# Altium footprint library mainLib.PcbLib: 169 footprints (part 10 of 11)
Each footprint in its own frame and in the unit in brackets; x right, y up, seen from the top. Pads: shape width x height; smd on the part's side, far side on the other; paste and mask are expansions set on the pad; w line width, h text height; cw(c..) or ccw(c..) is an arc to the next point about the centre after c.
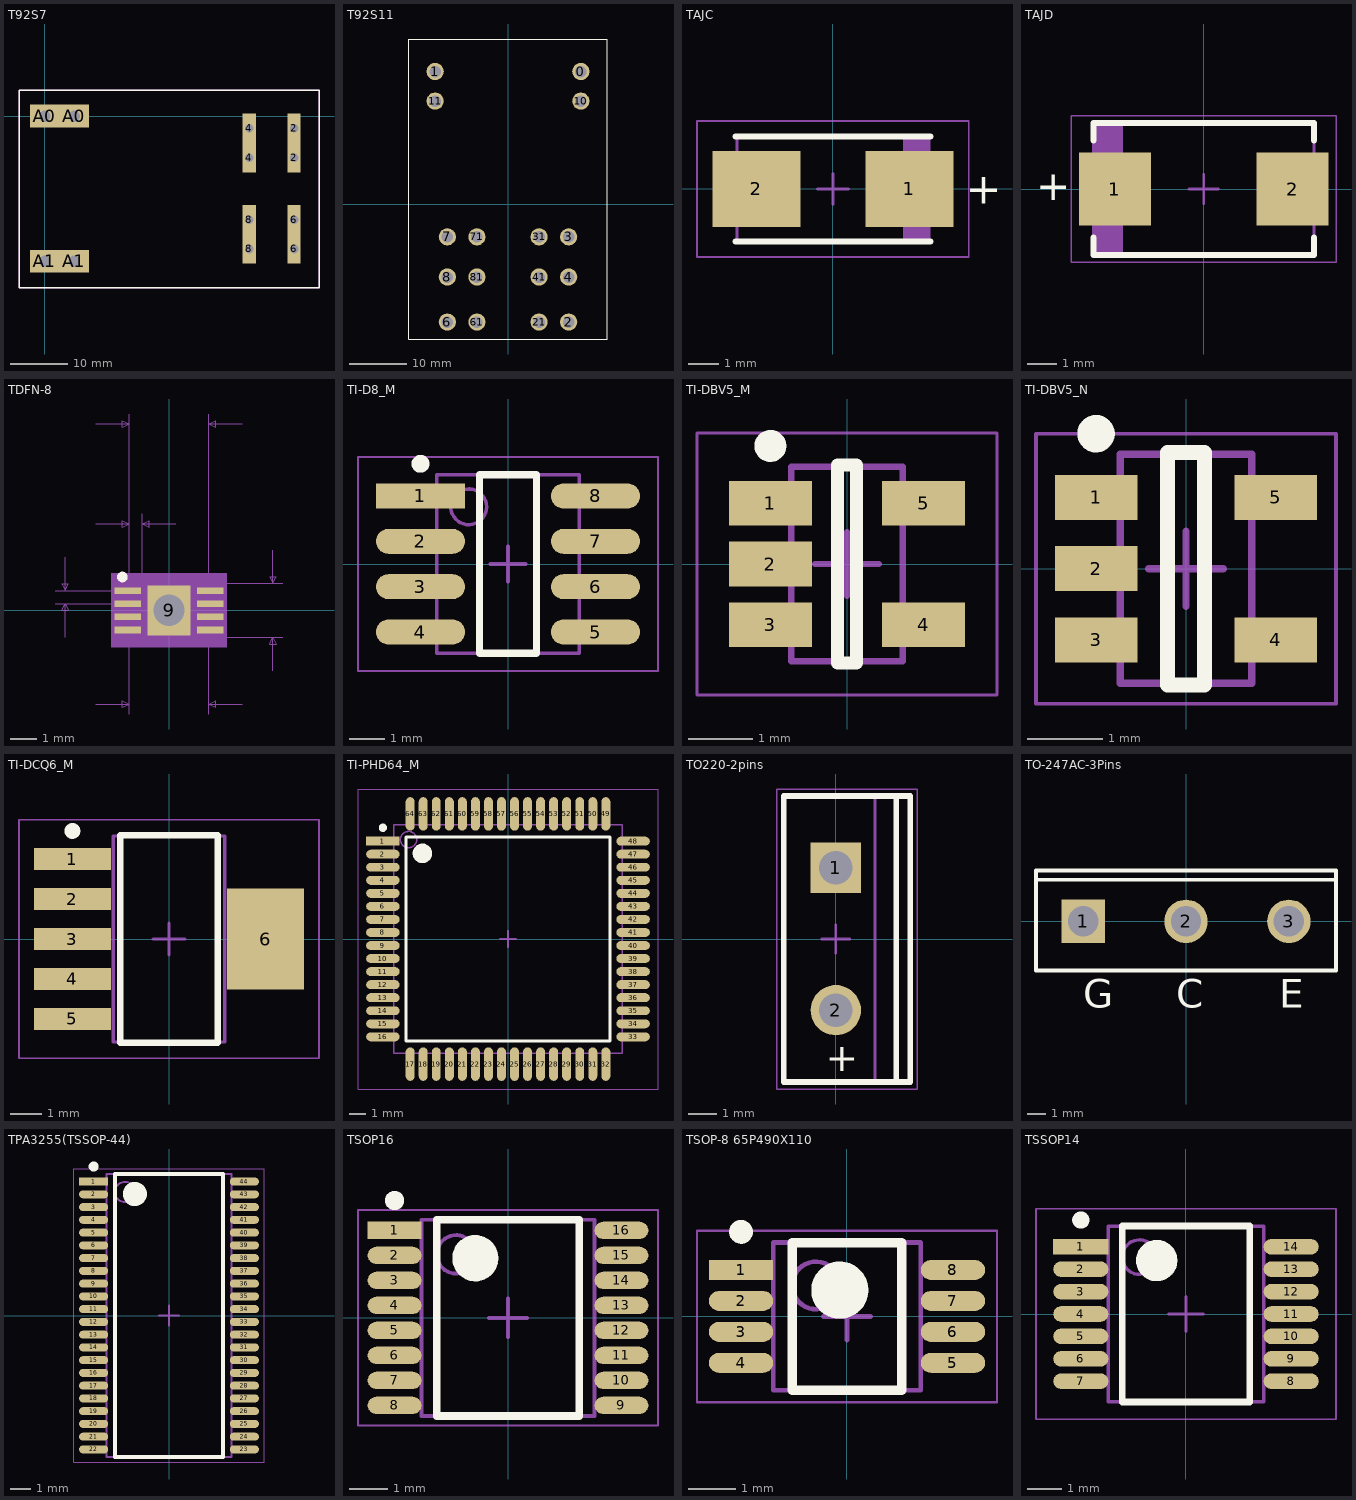
[diagram p9: the footprints below, top view; thin cyan lines are the x and y axes]

## T92S7 [mm]
pads (12):
  rect 2.3x5.15 hole 1.5: 2(43.65,-7.275) 2(43.65,-2.125) 4(35.8,-7.275) 4(35.8,-2.125) 6(43.65,-23.25) 6(43.65,-18.1) 8(35.8,-23.25) 8(35.8,-18.1)
  rect 5.15x4 hole 2: A0(0,0) A0(5.15,0) A1(0,-25.4) A1(5.15,-25.4)
Top Overlay:
  lines w0.254: -4.5,-30 48,-30 48,4 48,4.5 -4.5,4.5 -4.5,-30
Mechanical 13:
  lines w0.254: -4.5,-30 48,-30 48,4.5 -4.5,4.5 -4.5,-30 ; -2,-26.5 7,-26.5 7,-24.5 -2,-24.5 -2,-26.5 ; -2,-1 7,-1 7,1 -2,1 -2,-1 ; 35,-25 36.5,-25 36.5,-16.5 35,-16.5 35,-25 ; 35,-9 36.5,-9 36.5,-1 36.5,-0.5 35,-0.5 35,-8.5 35,-9 ; 43,-25 44.5,-25 44.5,-16.5 43,-16.5 43,-25 ; 43,-9 44.5,-9 44.5,-0.5 43,-0.5 43,-9
3D body: height 3, standoff 0, extent -1.999,-26.499 6.999,-24.501
3D body: height 3, standoff 0, extent -1.999,-26.499 6.999,-24.501
3D body: height 27.8, standoff 3, extent -4.627,-30.127 48.127,4.627
3D body: height 3, standoff 0, extent 43.001,-8.999 44.499,-0.501
3D body: height 3, standoff 0, extent 35.001,-8.999 36.499,-0.501
3D body: height 3, standoff 0, extent 43.001,-24.999 44.499,-16.501
3D body: height 3, standoff 0, extent 35.001,-24.999 36.499,-16.501
3D body: height 3, standoff 0, extent -1.999,-0.999 6.999,0.999

## T92S11 [mm]
pads (16):
  round 3 hole 2: 0(12.7,23.13) 1(-12.7,23.13) 2(10.58,-20.55) 3(10.58,-5.69) 4(10.58,-12.7) 6(-10.58,-20.55) 7(-10.58,-5.69) 8(-10.58,-12.7) 10(12.7,17.97) 11(-12.7,17.97) 21(5.42,-20.55) 31(5.42,-5.69) 41(5.42,-12.7) 61(-5.42,-20.55) 71(-5.42,-5.69) 81(-5.42,-12.7)
Top Overlay:
  lines w0.152: -17.3,-23.5 -17.3,28.8 17.3,28.8 17.3,-23.5 -17.3,-23.5
3D body "T92_3d.stp": height 30.75, standoff -3.95, extent -17.272,-23.545 17.272,28.779

## TAJC [mm] "Molded Capacitor, 2-Leads, Body 6,00x3,25mm, IPC Low Density"
height 2.6
pads (2):
  rect 2.85x2.45 smd: 1(2.475,0) 2(-2.475,0)
Top Overlay:
  lines w0.2: -3.15,-1.7 3.15,-1.7 ; -3.15,1.7 3.15,1.7
  text "+" at 4.293,-0.483 h1.02
Mechanical 13:
  rectangle: 2.266,-1.7 3.1,1.7
  lines w0.1: -3.1,-1.7 3.1,-1.7 3.1,1.7 -3.1,1.7 -3.1,-1.7
Mechanical 15:
  lines w0.05: -4.4,-2.2 4.4,-2.2 4.4,2.2 -4.4,2.2 -4.4,-2.2
  lines w0.1: -0.5,0 0.5,0 ; 0,-0.5 0,0.5
3D body: height 2.61, standoff 2.6, extent 2.287,-1.397 2.794,1.397
3D body "CAPMP6032X26M.step": height 2.6, standoff 0, extent -3.32,-1.7 3.32,1.7

## TAJD [mm] "Molded Capacitor, 2-Leads, Body 7,30x4,35mm, IPC Medium Density"
height 2
pads (2):
  rect 2.45x2.5 smd: 1(-3.025,0) 2(3.025,0)
Top Overlay:
  lines w0.2: -3.75,-1.65 -3.75,-2.25 3.75,-2.25 3.75,-1.65 ; -3.75,1.65 -3.75,2.25 3.75,2.25 3.75,1.65
  text "+" at -5.707,-0.383 h1.02
Mechanical 13:
  rectangle: -3.75,-2.25 -2.741,2.25
  lines w0.1: -3.75,-2.25 3.75,-2.25 3.75,2.25 -3.75,2.25 -3.75,-2.25
Mechanical 15:
  lines w0.05: -4.5,-2.5 4.5,-2.5 4.5,2.5 -4.5,2.5 -4.5,-2.5
  lines w0.1: -0.5,0 0.5,0 ; 0,-0.5 0,0.5
3D body "User Library-Tantalum Cap Case D.STEP": height 2.8, standoff 0, extent -3.57,-2.15 3.57,2.15

## TDFN-8 [mm] "MAX31740"
pads (10):
  round 0 hole 1.2: 0(0,0)
  rect 1x0.25 smd paste+0 mask+0: 1(-1.57,0.75) 2(-1.57,0.25) 3(-1.57,-0.25) 4(-1.57,-0.75) 5(1.57,-0.75) 6(1.57,-0.25) 7(1.57,0.25) 8(1.57,0.75)
  rect 1.653x1.905 smd paste+0 mask+0: 9(0,0)
Top Overlay:
  circle w0.25: c-1.778,1.27 r0.076
Mechanical 5:
  region: 2.205,-1.41 -2.205,-1.41 -2.205,1.41 2.205,1.41
Mechanical 7:
  lines w0.025: -4.341,0.25 -1.42,0.25 ; -4.341,0.75 -1.42,0.75 ; -3.96,-1.02 -3.96,0.25 ; -3.96,2.02 -3.96,0.75 ; -2.794,-3.569 -1.524,-3.569 ; -2.794,3.29 -1.524,3.29 ; -2.794,7.1 -1.524,7.1 ; -1.524,-3.95 -1.524,-1.029 ; -1.524,3.671 -1.524,0.75 -1.524,7.481 ; -1.016,0.75 -1.016,3.671 ; 0.254,3.29 -1.016,3.29 ; 1.524,-3.95 1.524,-1.029 4.341,-1.029 ; 1.524,0.75 1.524,7.481 ; 1.524,1.029 4.341,1.029 ; 2.794,-3.569 1.524,-3.569 ; 2.794,7.1 1.524,7.1 ; 3.96,-2.299 3.96,-1.029 ; 3.96,2.299 3.96,1.029 ; -3.96,0.25 -3.833,-0.004 -4.087,-0.004 -3.96,0.25 ; -3.96,0.75 -3.833,1.004 -4.087,1.004 -3.96,0.75 ; -1.524,-3.569 -1.778,-3.696 -1.778,-3.442 -1.524,-3.569 ; -1.524,3.29 -1.778,3.163 -1.778,3.417 -1.524,3.29 ; -1.524,7.1 -1.778,6.973 -1.778,7.227 -1.524,7.1 ; -1.016,3.29 -0.762,3.163 -0.762,3.417 -1.016,3.29 ; 1.524,-3.569 1.778,-3.696 1.778,-3.442 1.524,-3.569 ; 1.524,7.1 1.778,6.973 1.778,7.227 1.524,7.1 ; 3.96,-1.029 4.087,-1.283 3.833,-1.283 3.96,-1.029 ; 3.96,1.029 4.087,1.283 3.833,1.283 3.96,1.029
  text "0.12in/3.048mm" at -2.222,-4.712 h0.64
  text "0.081in/2.057mm" at 4.468,-0.318 h0.64
  text "0.02in/0.5mm" at -8.278,0.182 h0.64
  text "0.02in/0.508mm" at -3.492,3.798 h0.64
  text "0.12in/3.048mm" at -2.222,7.608 h0.64
  text "Alt 2 Padstyle: b229_152h76" at -8.572,-16.523 h1.27
  text "Alt 1 Padstyle: b152_229h76" at -8.572,-14.999 h1.27
  text "Heat Tab Padstyle: r175_190" at -8.572,-11.951 h1.27
  text "Default Padstyle: r81_22" at -7.62,-10.427 h1.27
Mechanical 13:
  lines w0: -0.305,1.029 ccw(c0,1.029) 0.305,1.029
  lines w0.025: -1.524,-1.029 -1.524,1.029 1.524,1.029 1.524,-1.029 -1.524,-1.029
3D body "21-0174B.step": height 0.81, standoff 0, extent -1.524,-1.029 1.524,1.029
3D body: height 0.25, standoff 0, extent 0,0 0.254,0.254

## TI-D8_M [mm] "SOIC, 8-Leads, Body 4.9x3.9mm, Pitch 1.27mm, IPC Low Density"
height 1.75
pads (8):
  rect 2.5x0.7 smd: 1(-2.45,1.905)
  oval 2.5x0.7 smd: 2(-2.45,0.635) 3(-2.45,-0.635) 4(-2.45,-1.905) 5(2.45,-1.905) 6(2.45,-0.635) 7(2.45,0.635) 8(2.45,1.905)
Top Overlay:
  circle w0.25: c-2.45,2.805 r0.125
  lines w0.2: -0.8,-2.5 -0.8,2.5 0.8,2.5 0.8,-2.5 -0.8,-2.5
Mechanical 13:
  circle w0.1: c-1.1,1.6 r0.5
  lines w0.1: -2,-2.5 -2,2.5 2,2.5 2,-2.5 -2,-2.5
Mechanical 15:
  lines w0.05: -4.2,-3 -4.2,3 4.2,3 4.2,-3 -4.2,-3
  lines w0.1: -0.5,0 0.5,0 ; 0,-0.5 0,0.5
3D body: height 1.75, standoff 0.1, extent -2,-2.5 2,2.5

## TI-DBV5_M [mm] "SOT23, 5-Leads, Body 2.9x1.6mm, Pitch 0.95mm, IPC Low Density"
height 1.45
pads (5):
  rect 1.3x0.7 smd: 1(-1.2,0.95) 2(-1.2,0) 3(-1.2,-0.95) 4(1.2,-0.95) 5(1.2,0.95)
Top Overlay:
  circle w0.25: c-1.2,1.85 r0.125
  lines w0.2: -0.15,-1.55 0.15,-1.55 0.15,1.55 -0.15,1.55 -0.15,-1.55
Mechanical 13:
  lines w0.1: -0.875,-1.525 -0.875,1.525 0.875,1.525 0.875,-1.525 -0.875,-1.525
Mechanical 15:
  lines w0.05: -2.35,-2.05 -2.35,2.05 2.35,2.05 2.35,-2.05 -2.35,-2.05
  lines w0.1: -0.5,0 0.5,0 ; 0,-0.5 0,0.5
3D body: height 1.45, standoff 0, extent -0.875,-1.525 0.875,1.525

## TI-DBV5_N [mm] "SOT23, 5-Leads, Body 2.9x1.6mm, Pitch 0.95mm, IPC Medium Density"
height 1.45
pads (5):
  rect 1.1x0.6 smd: 1(-1.2,0.95) 2(-1.2,0) 3(-1.2,-0.95) 4(1.2,-0.95) 5(1.2,0.95)
Top Overlay:
  circle w0.25: c-1.2,1.8 r0.125
  lines w0.2: -0.25,-1.55 -0.25,1.55 0.25,1.55 0.25,-1.55 -0.25,-1.55
Mechanical 13:
  lines w0.1: -0.875,-1.525 0.875,-1.525 0.875,1.525 -0.875,1.525 -0.875,-1.525
Mechanical 15:
  lines w0.05: -2,-1.8 2,-1.8 2,1.8 -2,1.8 -2,-1.8
  lines w0.1: -0.5,0 0.5,0 ; 0,-0.5 0,0.5
3D body: height 1.45, standoff 0, extent -0.875,-1.525 0.875,1.525

## TI-DCQ6_M [mm] "SOT223, 6-Leads, Body 6.5x3.5mm, Pitch 1.27mm, IPC Low Density"
height 1.8
pads (6):
  rect 2.45x0.7 smd: 1(-3.075,2.54) 2(-3.075,1.27) 3(-3.075,0) 4(-3.075,-1.27) 5(-3.075,-2.54)
  rect 2.45x3.2 smd: 6(3.075,0)
Top Overlay:
  circle w0.25: c-3.075,3.44 r0.125
  lines w0.2: -1.55,-3.3 -1.55,3.3 1.55,3.3 1.55,-3.3 -1.55,-3.3
Mechanical 13:
  lines w0.1: -1.775,-3.275 -1.775,3.275 1.775,3.275 1.775,-3.275 -1.775,-3.275
Mechanical 15:
  lines w0.05: -4.775,-3.8 -4.775,3.8 4.775,3.8 4.775,-3.8 -4.775,-3.8
  lines w0.1: -0.5,0 0.5,0 ; 0,-0.5 0,0.5
3D body: height 1.8, standoff 0.02, extent -1.775,-3.275 1.775,3.275

## TI-PHD64_M [mm] "QFP, 64-Leads, Body 14x14mm, Pitch 0.8mm, IPC Low Density"
height 1.2
pads (64):
  rect 2.05x0.55 smd: 1(-7.675,6)
  oval 2.05x0.55 smd: 2(-7.675,5.2) 3(-7.675,4.4) 4(-7.675,3.6) 5(-7.675,2.8) 6(-7.675,2) 7(-7.675,1.2) 8(-7.675,0.4) 9(-7.675,-0.4) 10(-7.675,-1.2) 11(-7.675,-2) 12(-7.675,-2.8) 13(-7.675,-3.6) 14(-7.675,-4.4) 15(-7.675,-5.2) 16(-7.675,-6) 33(7.675,-6) 34(7.675,-5.2) 35(7.675,-4.4) 36(7.675,-3.6) 37(7.675,-2.8) 38(7.675,-2) 39(7.675,-1.2) 40(7.675,-0.4) 41(7.675,0.4) 42(7.675,1.2) 43(7.675,2) 44(7.675,2.8) 45(7.675,3.6) 46(7.675,4.4) 47(7.675,5.2) 48(7.675,6)
  oval 0.55x2.05 smd: 17(-6,-7.675) 18(-5.2,-7.675) 19(-4.4,-7.675) 20(-3.6,-7.675) 21(-2.8,-7.675) 22(-2,-7.675) 23(-1.2,-7.675) 24(-0.4,-7.675) 25(0.4,-7.675) 26(1.2,-7.675) 27(2,-7.675) 28(2.8,-7.675) 29(3.6,-7.675) 30(4.4,-7.675) 31(5.2,-7.675) 32(6,-7.675) 49(6,7.675) 50(5.2,7.675) 51(4.4,7.675) 52(3.6,7.675) 53(2.8,7.675) 54(2,7.675) 55(1.2,7.675) 56(0.4,7.675) 57(-0.4,7.675) 58(-1.2,7.675) 59(-2,7.675) 60(-2.8,7.675) 61(-3.6,7.675) 62(-4.4,7.675) 63(-5.2,7.675) 64(-6,7.675)
Top Overlay:
  circle w0.25: c-7.675,6.825 r0.125
  circle w0.6: c-5.25,5.25 r0.3
  lines w0.2: -6.25,-6.25 -6.25,6.25 6.25,6.25 6.25,-6.25 -6.25,-6.25
Mechanical 13:
  circle w0.1: c-6.1,6.1 r0.5
  lines w0.1: -7,-7 -7,7 7,7 7,-7 -7,-7
Mechanical 15:
  lines w0.05: -9.2,-9.2 -9.2,9.2 9.2,9.2 9.2,-9.2 -9.2,-9.2
  lines w0.1: -0.5,0 0.5,0 ; 0,-0.5 0,0.5
3D body: height 1.2, standoff 0.05, extent -7,-7 7,7

## TO220-2pins [mm] "FM, 2-Leads, Body 10x4.4mm, Pitch 5.08mm"
height 19.65
pads (2):
  rect 1.8x1.8 hole 1.2: 1(0,2.54)
  round 1.8 hole 1.2: 2(0,-2.54)
Top Overlay:
  lines w0.2: 2.15,-5.1 2.15,5.1 ; -1.85,-5.1 2.65,-5.1 2.65,5.1 -1.85,5.1 -1.85,-5.1
  text "+" at -0.35,-4.725 h1.02
Mechanical 13:
  lines w0.1: 1.4,-5.1 1.4,5.1 ; -1.85,-5.1 -1.85,5.1 2.65,5.1 2.65,-5.1 -1.85,-5.1
Mechanical 15:
  lines w0.05: -2.1,-5.35 -2.1,5.35 2.9,5.35 2.9,-5.35 -2.1,-5.35
  lines w0.1: -0.5,0 0.5,0 ; 0,-0.5 0,0.5
3D body: height 3.3, standoff 0, extent -0.25,1.895 0.25,3.185
3D body: height 0, standoff -1.6, extent -0.25,2.165 0.25,2.915
3D body: height 3.3, standoff 0, extent -0.25,-3.185 0.25,-1.895
3D body: height 0, standoff -1.6, extent -0.25,-2.915 0.25,-2.165
3D body: height 13.25, standoff 3.3, extent -1.85,-5.1 2.65,5.1
3D body: height 15.03, standoff 13.25, extent 1.4,-5 2.65,5
3D body: height 15.07, standoff 15.03, extent 1.4,0.356 2.65,5
3D body: height 15.07, standoff 15.03, extent 1.4,-5 2.65,-0.356
3D body: height 18.68, standoff 18.64, extent 1.4,0.356 2.65,5
3D body: height 18.68, standoff 18.64, extent 1.4,-5 2.65,-0.356
3D body: height 15.17, standoff 15.06, extent 1.4,0.698 2.65,5
3D body: height 15.17, standoff 15.06, extent 1.4,-5 2.65,-0.698
3D body: height 18.64, standoff 18.54, extent 1.4,0.698 2.65,5
3D body: height 18.64, standoff 18.54, extent 1.4,-5 2.65,-0.698
3D body: height 15.34, standoff 15.16, extent 1.4,1.014 2.65,5
3D body: height 15.34, standoff 15.16, extent 1.4,-5 2.65,-1.014
3D body: height 18.54, standoff 18.37, extent 1.4,1.014 2.65,5
3D body: height 18.54, standoff 18.37, extent 1.4,-5 2.65,-1.014
3D body: height 15.56, standoff 15.33, extent 1.4,1.29 2.65,5
3D body: height 15.56, standoff 15.33, extent 1.4,-5 2.65,-1.29
3D body: height 18.37, standoff 18.14, extent 1.4,1.29 2.65,5
3D body: height 18.37, standoff 18.14, extent 1.4,-5 2.65,-1.29
3D body: height 15.84, standoff 15.56, extent 1.4,1.517 2.65,5
3D body: height 15.84, standoff 15.56, extent 1.4,-5 2.65,-1.517
3D body: height 18.15, standoff 17.86, extent 1.4,1.517 2.65,5
3D body: height 18.15, standoff 17.86, extent 1.4,-5 2.65,-1.517
3D body: height 16.16, standoff 15.84, extent 1.4,1.686 2.65,5
3D body: height 16.16, standoff 15.84, extent 1.4,-5 2.65,-1.686
3D body: height 17.87, standoff 17.55, extent 1.4,1.686 2.65,5
3D body: height 17.87, standoff 17.55, extent 1.4,-5 2.65,-1.686
3D body: height 16.5, standoff 16.15, extent 1.4,1.79 2.65,5
3D body: height 16.5, standoff 16.15, extent 1.4,-5 2.65,-1.79
3D body: height 17.55, standoff 17.21, extent 1.4,1.79 2.65,5
3D body: height 17.55, standoff 17.21, extent 1.4,-5 2.65,-1.79
3D body: height 16.85, standoff 16.49, extent 1.4,1.825 2.65,5
3D body: height 16.85, standoff 16.49, extent 1.4,-5 2.65,-1.825
3D body: height 17.21, standoff 16.85, extent 1.4,1.825 2.65,5
3D body: height 17.21, standoff 16.85, extent 1.4,-5 2.65,-1.825
3D body: height 19.65, standoff 18.68, extent 1.4,-5 2.65,5

## TO-247AC-3Pins [mm] "SIP with Mounting Hole; 3 Leads; Body 20 x 15.6 x 5 mm (typ); Pitch 5.45 mm"
height 24.6
pads (3):
  rect 2.3x2.3 hole 1.6: 1(-5.45,0)
  round 2.3 hole 1.6: 2(0,0) 3(5.45,0)
Top Overlay:
  lines w0.2: -7.95,2.2 7.95,2.2 ; -7.95,-2.6 7.95,-2.6 7.95,2.7 -7.95,2.7 -7.95,-2.6
  text "G" at -5.45,-4.575 h1.5
  text "C" at -0.508,-4.575 h1.5
  text "E" at 4.942,-4.575 h1.5
3D body "TO-247.STEP": height 30.5, standoff -8.5, extent -7.75,-3 7.75,2

## TPA3255(TSSOP-44) [mm] "TSOP, 44-Leads, Body 14,00x6,10mm, Pitch 0,64mm, IPC Medium Density"
height 1.2
pads (44):
  rect 1.45x0.4 smd: 1(-3.75,6.667)
  oval 1.45x0.4 smd: 2(-3.75,6.032) 3(-3.75,5.397) 4(-3.75,4.763) 5(-3.75,4.127) 6(-3.75,3.492) 7(-3.75,2.857) 8(-3.75,2.222) 9(-3.75,1.587) 10(-3.75,0.953) 11(-3.75,0.318) 12(-3.75,-0.318) 13(-3.75,-0.953) 14(-3.75,-1.587) 15(-3.75,-2.222) 16(-3.75,-2.857) 17(-3.75,-3.492) 18(-3.75,-4.127) 19(-3.75,-4.763) 20(-3.75,-5.397) 21(-3.75,-6.032) 22(-3.75,-6.667) 23(3.75,-6.667) 24(3.75,-6.032) 25(3.75,-5.397) 26(3.75,-4.763) 27(3.75,-4.127) 28(3.75,-3.492) 29(3.75,-2.857) 30(3.75,-2.222) 31(3.75,-1.587) 32(3.75,-0.953) 33(3.75,-0.318) 34(3.75,0.318) 35(3.75,0.953) 36(3.75,1.587) 37(3.75,2.222) 38(3.75,2.857) 39(3.75,3.492) 40(3.75,4.127) 41(3.75,4.763) 42(3.75,5.397) 43(3.75,6.032) 44(3.75,6.667)
Top Overlay:
  circle w0.6: c-1.7,6.05 r0.3
  circle w0.25: c-3.75,7.418 r0.125
  lines w0.2: -2.7,-7.05 2.7,-7.05 2.7,7.05 -2.7,7.05 -2.7,-7.05
Mechanical 13:
  circle w0.1: c-2.2,6.15 r0.5
  lines w0.1: -3.1,-7.05 3.1,-7.05 3.1,7.05 -3.1,7.05 -3.1,-7.05
Mechanical 15:
  lines w0.05: -4.75,-7.3 4.75,-7.3 4.75,7.3 -4.75,7.3 -4.75,-7.3
  lines w0.1: -0.5,0 0.5,0 ; 0,-0.5 0,0.5
3D body "TPA3255(TSSOP-44).step": height 1.2, standoff 0, extent -4.05,-7.05 4.05,7.05

## TSOP16 [mm] "TSOP, 16-Leads, Body 5,00x4,40mm, Pitch 0,65mm, IPC Medium Density"
height 1.2
pads (16):
  rect 1.4x0.45 smd: 1(-2.95,2.275)
  oval 1.4x0.45 smd: 2(-2.95,1.625) 3(-2.95,0.975) 4(-2.95,0.325) 5(-2.95,-0.325) 6(-2.95,-0.975) 7(-2.95,-1.625) 8(-2.95,-2.275) 9(2.95,-2.275) 10(2.95,-1.625) 11(2.95,-0.975) 12(2.95,-0.325) 13(2.95,0.325) 14(2.95,0.975) 15(2.95,1.625) 16(2.95,2.275)
Top Overlay:
  circle w0.6: c-0.85,1.55 r0.3
  circle w0.25: c-2.95,3.05 r0.125
  lines w0.2: -1.85,-2.55 1.85,-2.55 1.85,2.55 -1.85,2.55 -1.85,-2.55
Mechanical 13:
  circle w0.1: c-1.35,1.65 r0.5
  lines w0.1: -2.25,-2.55 2.25,-2.55 2.25,2.55 -2.25,2.55 -2.25,-2.55
Mechanical 15:
  lines w0.05: -3.9,-2.8 3.9,-2.8 3.9,2.8 -3.9,2.8 -3.9,-2.8
  lines w0.1: -0.5,0 0.5,0 ; 0,-0.5 0,0.5
3D body "TSOP -16N.step": height 1.2, standoff 0, extent -3.2,-2.55 3.2,2.55

## TSOP-8 65P490X110 [mm] "TSOP, 8-Leads, Body 3,00x3,00mm, Pitch 0,65mm, IPC Medium Density"
height 1.1
pads (8):
  rect 1.35x0.419 smd: 1(-2.225,0.975)
  oval 1.35x0.419 smd: 2(-2.225,0.325) 3(-2.225,-0.325) 4(-2.225,-0.975) 5(2.225,-0.975) 6(2.225,-0.325) 7(2.225,0.325) 8(2.225,0.975)
Top Overlay:
  circle w0.6: c-0.15,0.55 r0.3
  circle w0.25: c-2.225,1.775 r0.125
  lines w0.2: -1.15,-1.55 1.15,-1.55 1.15,1.55 -1.15,1.55 -1.15,-1.55
Mechanical 13:
  circle w0.1: c-0.65,0.65 r0.5
  lines w0.1: -1.55,-1.55 1.55,-1.55 1.55,1.55 -1.55,1.55 -1.55,-1.55
Mechanical 15:
  lines w0.05: -3.15,-1.8 3.15,-1.8 3.15,1.8 -3.15,1.8 -3.15,-1.8
  lines w0.1: -0.5,0 0.5,0 ; 0,-0.5 0,0.5
3D body "TSOP65P490X110-8N.step": height 1.1, standoff 0, extent -2.45,-1.55 2.45,1.55

## TSSOP14 [mm] "SOP, 14-Leads, Body 5.1x4.5mm, Pitch 0.65mm, IPC Low Density"
height 1.2
pads (14):
  rect 1.6x0.45 smd: 1(-3.05,1.95)
  oval 1.6x0.45 smd: 2(-3.05,1.3) 3(-3.05,0.65) 4(-3.05,0) 5(-3.05,-0.65) 6(-3.05,-1.3) 7(-3.05,-1.95) 8(3.05,-1.95) 9(3.05,-1.3) 10(3.05,-0.65) 11(3.05,0) 12(3.05,0.65) 13(3.05,1.3) 14(3.05,1.95)
Top Overlay:
  circle w0.6: c-0.85,1.55 r0.3
  circle w0.25: c-3.05,2.725 r0.125
  lines w0.2: -1.85,-2.55 1.85,-2.55 1.85,2.55 -1.85,2.55 -1.85,-2.55
Mechanical 13:
  circle w0.1: c-1.35,1.65 r0.5
  lines w0.1: -2.25,-2.55 2.25,-2.55 2.25,2.55 -2.25,2.55 -2.25,-2.55
Mechanical 15:
  lines w0.05: -4.35,-3.05 4.35,-3.05 4.35,3.05 -4.35,3.05 -4.35,-3.05
  lines w0.1: -0.5,0 0.5,0 ; 0,-0.5 0,0.5
3D body "PW0014AakaMTC14.stp": height 1.2, standoff 0, extent -3.21,-2.5 3.21,2.5